# Altium footprint library lib_protel_HC_BOINA.PCBLIB: 726 footprints (part 4 of 46)
Each footprint in its own frame and in the unit in brackets; x right, y up, seen from the top. Pads: shape width x height; smd on the part's side, far side on the other; paste and mask are expansions set on the pad; w line width, h text height; cw(c..) or ccw(c..) is an arc to the next point about the centre after c.
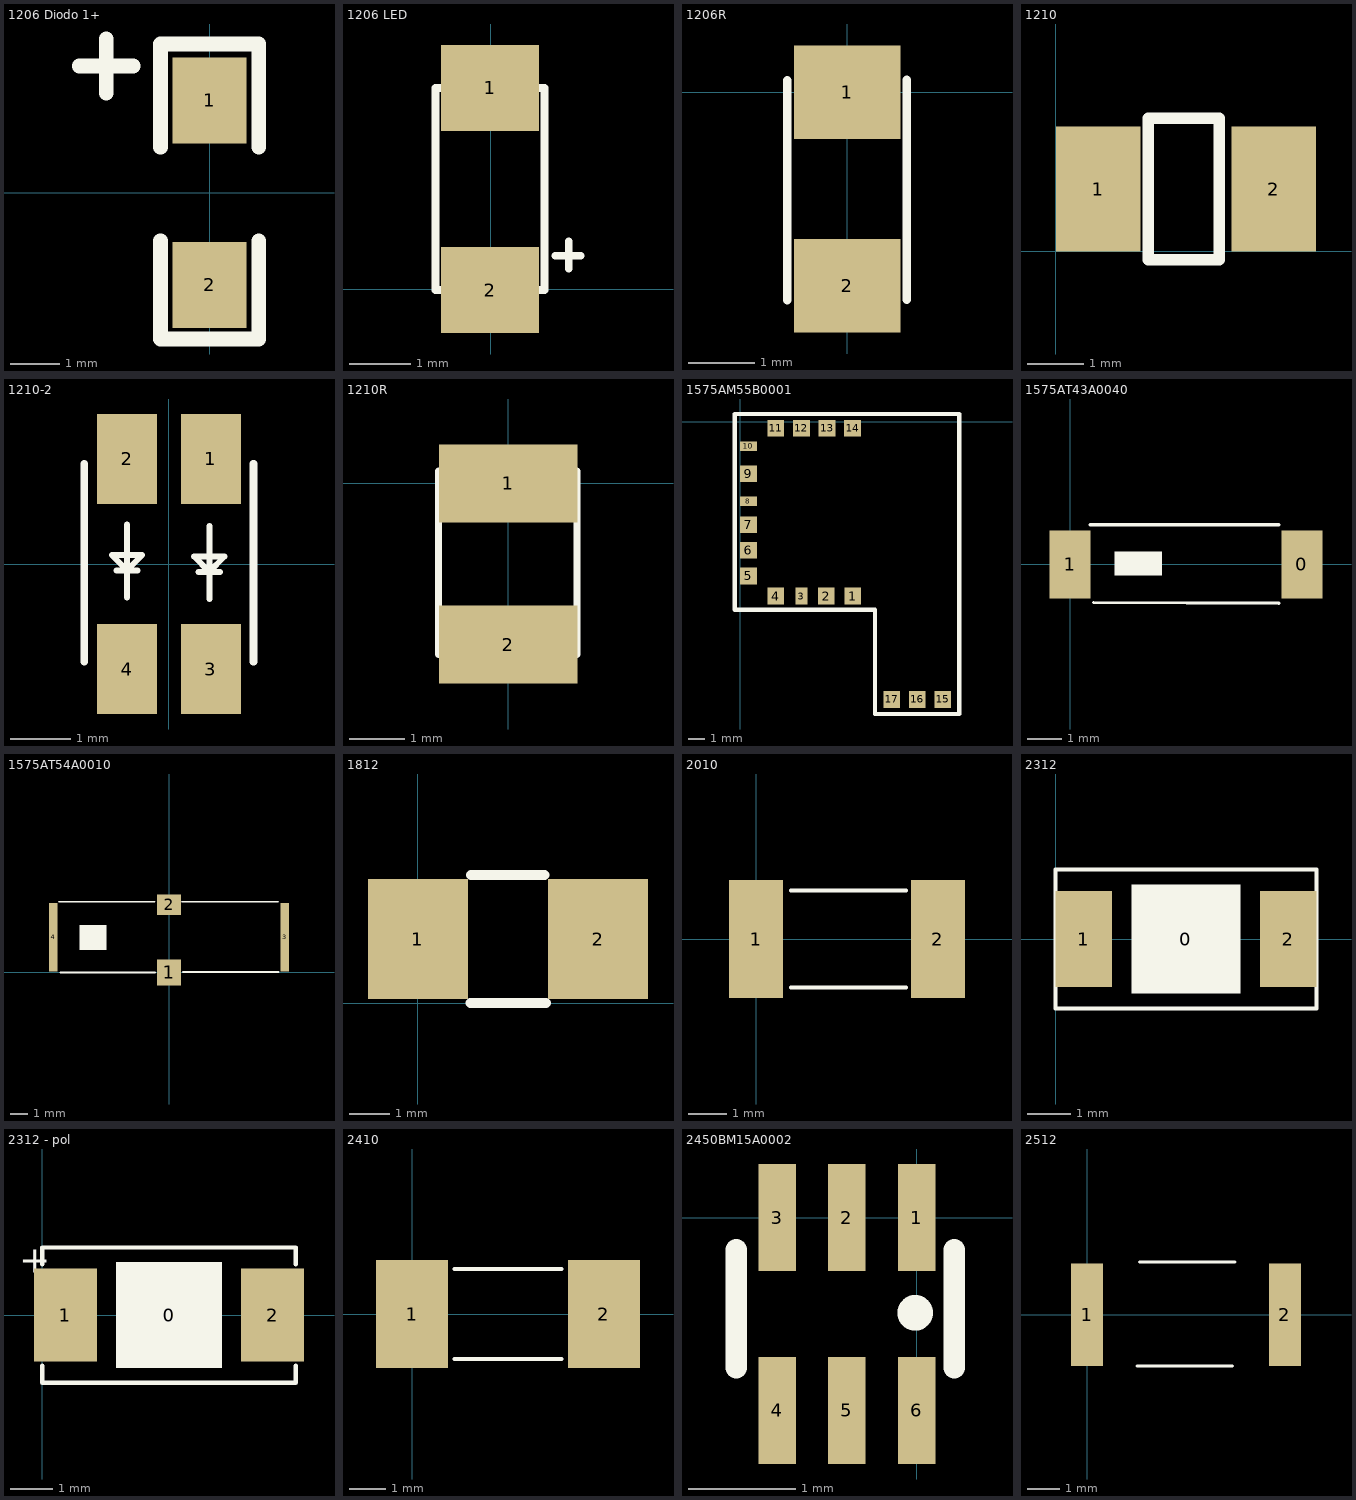
[diagram p3: the footprints below, top view; thin cyan lines are the x and y axes]

## 1206 Diodo 1+ [mm] "Diodo 1206 Pads 1.5x1.75"
height 0.75
pads (2):
  rect 1.5x1.75 smd: 1(0,1.875) 2(0,-1.875)
Top Overlay:
  lines w0.3: -2.65,2.575 -1.55,2.575 ; -2.1,2.025 -2.1,3.125 ; -1,-0.975 -1,-2.875 -1,-2.975 1,-2.975 1,-0.975 ; -1,0.925 -1,3.025 1,3.025 1,0.925
3D body "User Library-led_1206.step": height 1.1, standoff 0, extent -0.8,-1.61 0.8,1.61

## 1206 LED [mm] "LED 1206"
height 1.1
pads (2):
  rect 1.6x1.4 smd: 1(-0.012,3.29) 2(-0.012,-0.012)
Top Overlay:
  lines w0.127: 1.055,0.55 1.465,0.55 ; 1.275,0.34 1.275,0.78 ; -0.901,-0.012 0.877,-0.012 0.877,3.29 -0.901,3.29 -0.901,-0.012

## 1206R [mm] "footprint LEDS_RESIST 1206 REDUCIDOS"
pads (2):
  rect 1.6x1.4 smd: 1(0,0) 2(0,-2.9)
Top Overlay:
  lines w0.127: -0.9,-3.122 -0.9,0.18 ; 0.89,-3.112 0.89,0.19
3D body "User Library-RES_3216-1206.step": height 0.85, standoff 0, extent -0.865,-3.125 0.865,0.225

## 1210 [mm]
pads (2):
  rect 1.5x2.2 smd: 1(0.75,1.1) 2(3.85,1.1)
Top Overlay:
  lines w0.203: 1.63,-0.15 2.89,-0.15 2.89,2.35 1.63,2.35 1.63,-0.15

## 1210-2 [mm] "LED LTST-C155"
height 1.1
pads (4):
  rect 1x1.5 smd: 1(0.7,1.75) 2(-0.7,1.75) 3(0.7,-1.75) 4(-0.7,-1.75)
Top Overlay:
  lines w0.1: -0.878,-0.104 -0.522,-0.104 ; -0.7,-0.561 -0.7,0.658 ; -0.7,-0.206 -0.7,-0.104 ; 0.494,-0.13 0.849,-0.13 ; 0.672,-0.587 0.672,0.632 ; 0.672,-0.231 0.672,-0.13 ; -0.7,-0.104 -0.446,0.15 -0.954,0.15 -0.7,-0.104 ; 0.672,-0.13 0.418,0.124 0.926,0.124 0.672,-0.13
  lines w0.127: -1.411,-1.628 -1.411,1.674 ; 1.408,-1.628 1.408,1.674
3D body: height 0.5, standoff 0, extent -1.35,-1.6 1.35,1.6
3D body: height 1.05, standoff 0.5, extent -1.35,-1.05 1.35,1.025

## 1210R [mm] "footprint LEDS_RESIST 1210"
pads (2):
  rect 2.5x1.4 smd: 1(0,0) 2(0,-2.9)
Top Overlay:
  lines w0.127: -1.259,-3.082 -1.259,0.22 ; 1.239,-3.082 1.239,0.22

## 1575AM55B0001 [mm] "Antena GPS Active"
height 0.142
pads (17):
  rect 1x1 smd mask+0.165: 1(6.74,-10.44) 2(5.16,-10.44)
  rect 0.74x1 smd mask+0.075: 3(3.67,-10.44)
  rect 1x1 smd mask+0.075: 4(2.14,-10.44) 5(0.5,-9.24) 6(0.5,-7.71) 7(0.5,-6.18) 11(2.14,-0.4) 12(3.67,-0.4) 13(5.2,-0.4) 15(12.13,-16.63) 16(10.6,-16.63) 17(9.07,-16.63)
  rect 1x0.57 smd mask+0.075: 8(0.5,-4.77)
  rect 1x1 smd mask+0.2: 9(0.5,-3.125)
  rect 1x0.58 smd mask+0.075: 10(0.5,-1.48)
  rect 1x1 smd paste+0 mask+0.075: 14(6.73,-0.4)
Top Overlay:
  lines w0.254: -0.32,-11.26 -0.32,0.45 13.11,0.45 13.11,-17.5 8.07,-17.5 8.07,-11.26 -0.32,-11.26

## 1575AT43A0040 [mm] "Antena GPS Pasiva"
height 0.8
pads (2):
  rect 1.2x2 smd: 0(6.8,0) 1(0,0)
Top Overlay:
  rectangle: 1.295,-0.33 2.692,0.381
  lines w0.1: 0.584,1.168 6.121,1.168 ; 0.686,-1.118 6.121,-1.143

## 1575AT54A0010 [mm] "Antena GPS Pasiva"
height 3.2
pads (4):
  rect 1.4x1.5 smd: 1(0,0)
  rect 1.4x1.2 smd: 2(0,3.95)
  rect 0.5x4 smd: 3(6.75,2.05) 4(-6.75,2.05)
Top Overlay:
  rectangle: -5.232,1.321 -3.632,2.769
  lines w0.1: -6.426,4.115 -0.838,4.115 ; -6.35,0 -0.813,0 ; 0.737,4.115 6.375,4.115 ; 0.813,0.025 6.401,0.025

## 1812 [mm]
height 3.2
pads (2):
  rect 2.5x3 smd: 1(0,1.6) 2(4.5,1.6)
Top Overlay:
  lines w0.254: 1.32,0 3.2,0 ; 1.33,3.2 3.16,3.2

## 2010 [mm]
height 2.5
pads (2):
  rect 1.4x3.05 smd: 1(0,0) 2(4.7,0)
Top Overlay:
  lines w0.1: 0.9,-1.25 3.875,-1.25 ; 0.9,1.25 3.875,1.25
3D body: height 2.5, standoff 0, extent -0.112,-1.25 4.713,1.25

## 2312 [mm] "2312"
height 2.5
pads (3):
  rect 2.5x2.5 on Top Overlay: 0(3,0)
  rect 1.3x2.2 smd: 1(0.65,0) 2(5.35,0)
Top Overlay:
  lines w0.1: 0,-1.6 6,-1.6 6,1.6 0,1.6 0,0 0,-1.6

## 2312 - pol [mm] "2312"
height 2.5
pads (3):
  rect 2.5x2.5 on Top Overlay: 0(3,0)
  rect 1.5x2.2 smd: 1(0.55,0) 2(5.45,0)
Top Overlay:
  lines w0.1: 0,-1.2 0,-1.6 6,-1.6 6,-1.2 ; 0,1.2 0,1.6 6,1.6 6,1.2
  text "+" at -0.55,1 h0.65

## 2410 [mm] "fuse"
height 2.5
pads (2):
  rect 2x3 smd: 1(0,0) 2(5.325,0)
Top Overlay:
  lines w0.1: 1.175,-1.25 4.15,-1.25 ; 1.175,1.25 4.15,1.25
3D body: height 2.5, standoff 0, extent 0.263,-1.25 5.088,1.25

## 2450BM15A0002 [mm] "Balun para CC253X y CC254x"
height 0.7
pads (6):
  rect 0.35x1 smd: 1(0,0) 2(-0.65,0) 3(-1.3,0) 4(-1.3,-1.8) 5(-0.65,-1.8) 6(0,-1.8)
Top Overlay:
  circle w0.254: c-0.014,-0.889 r0.039
  lines w0.2: -1.682,-1.4 -1.682,-0.3 ; 0.35,-1.4 0.35,-0.3
3D body: height 0.72, standoff 0.7, extent -0.25,-1.1 0.175,-0.7
3D body: height 0.72, standoff 0, extent -0.15,-0.275 0.15,-0.225
3D body: height 0.72, standoff 0, extent -0.8,-0.275 -0.5,-0.225
3D body: height 0.72, standoff 0, extent -1.45,-0.275 -1.15,-0.225
3D body: height 0.72, standoff 0, extent -1.45,-1.575 -1.15,-1.525
3D body: height 0.72, standoff 0, extent -0.8,-1.575 -0.5,-1.525
3D body: height 0.72, standoff 0, extent -0.15,-1.575 0.15,-1.525
3D body: height 0.7, standoff 0, extent -1.65,-1.55 0.35,-0.25

## 2512 [mm]
height 0.7
pads (2):
  rect 1x3.2 smd: 1(0,0) 2(6.2,0)
Top Overlay:
  lines w0.1: 1.575,-1.6 4.55,-1.6 ; 1.65,1.65 4.625,1.65
3D body: height 2.5, standoff 0, extent 0.263,-1.25 5.975,1.25